# Altium footprint library SMD_Bauteile.PcbLib: 355 footprints (part 4 of 23)
Each footprint in its own frame and in the unit in brackets; x right, y up, seen from the top. Pads: shape width x height; smd on the part's side, far side on the other; paste and mask are expansions set on the pad; w line width, h text height; cw(c..) or ccw(c..) is an arc to the next point about the centre after c.
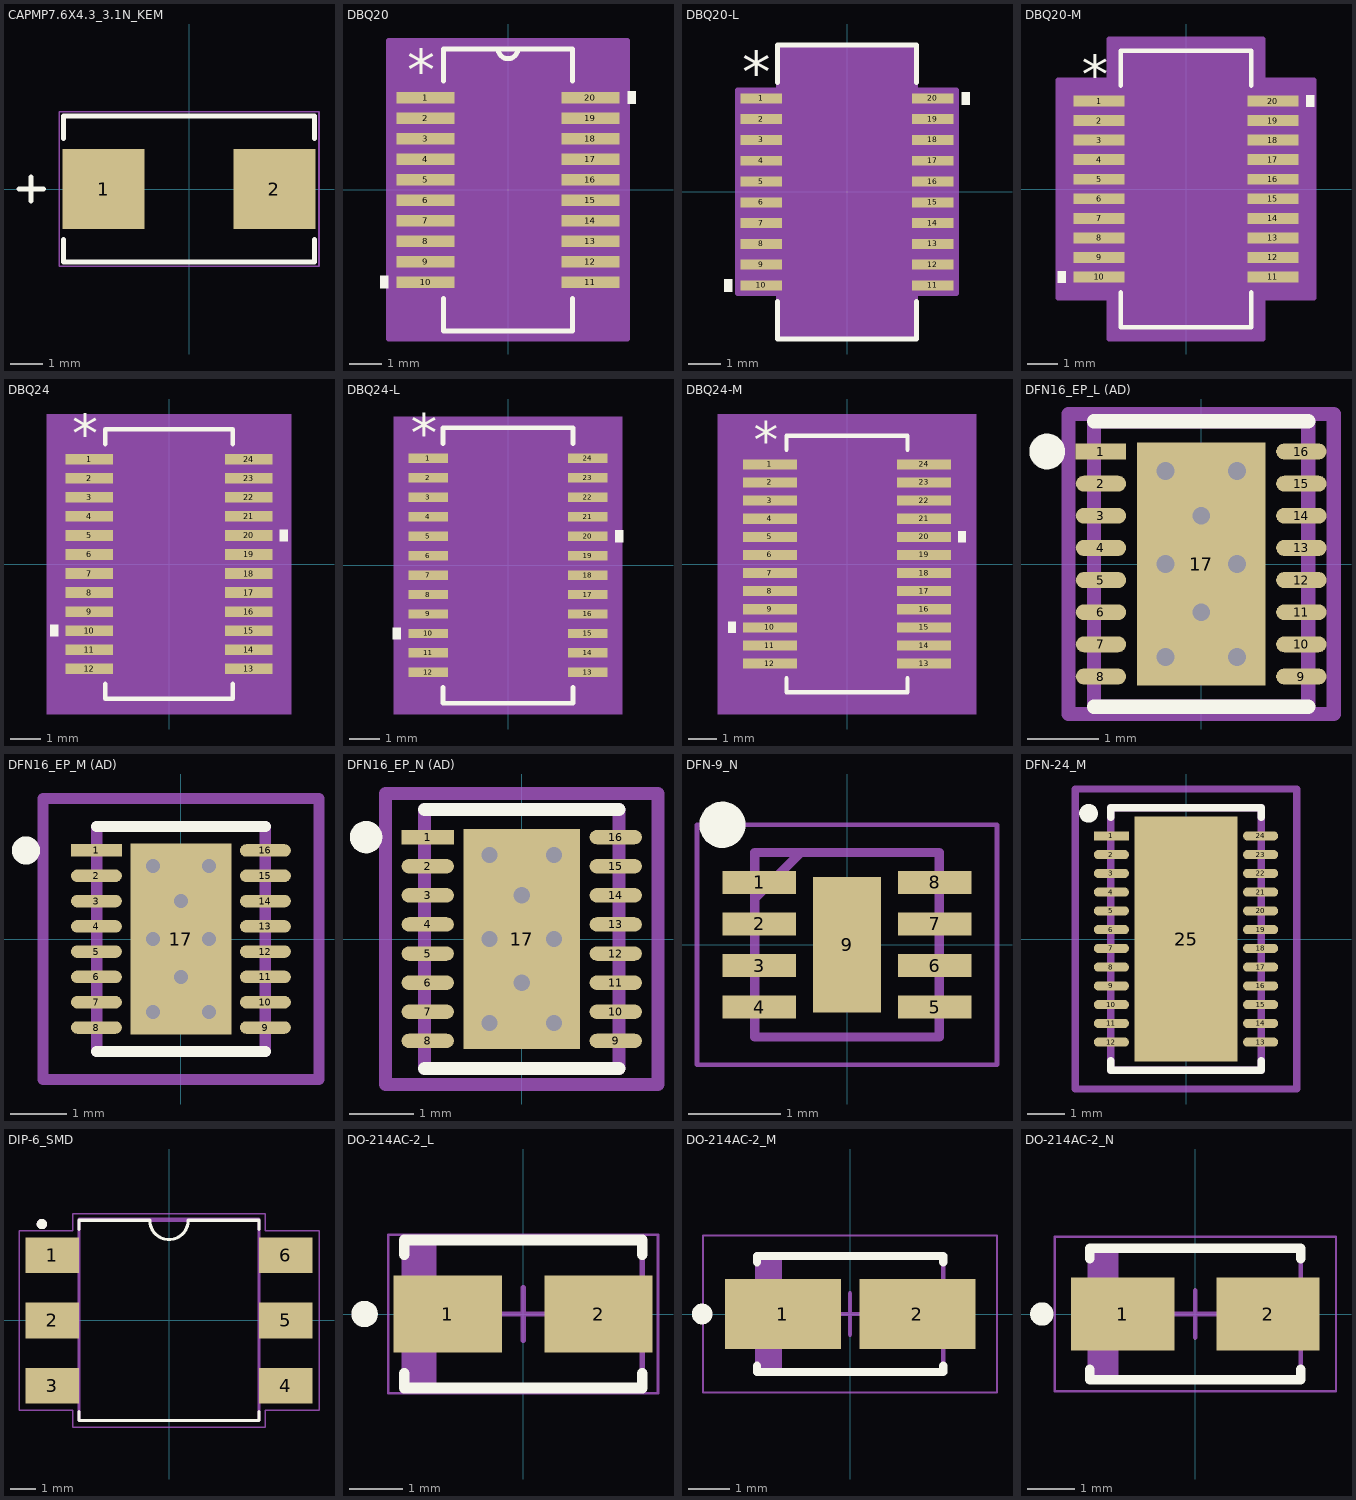
[diagram p3: the footprints below, top view; thin cyan lines are the x and y axes]

## CAPMP7.6X4.3_3.1N_KEM [mm]
pads (2):
  rect 2.56x2.5 smd paste+0 mask+0: 1(-2.672,0) 2(2.672,0)
Top Overlay:
  lines w0.152: -5.316,0 -4.554,0 ; -4.935,-0.381 -4.935,0.381 ; -3.927,-1.583 -3.927,-2.277 3.927,-2.277 3.927,-1.583 ; -3.927,1.583 -3.927,2.277 3.927,2.277 3.927,1.583
Mech Misc 1:
  lines w0.05: -5.316,0 -4.554,0 ; -4.935,-0.381 -4.935,0.381 ; -4.054,-2.413 -4.054,2.413 4.064,2.413 4.064,-2.413 -4.054,-2.413
3D body "CAPMP76X43_31N_KEM.step": height 3.15, standoff 0, extent -3.775,-2.15 3.825,2.15

## DBQ20 [mil]
pads (20):
  rect 71x14 smd paste-35.5 mask-35.5: 1(-100.5,112.5) 2(-100.5,87.5) 3(-100.5,62.5) 4(-100.5,37.5) 5(-100.5,12.5) 6(-100.5,-12.5) 7(-100.5,-37.5) 8(-100.5,-62.5) 9(-100.5,-87.5) 10(-100.5,-112.5) 11(100.5,-112.5) 12(100.5,-87.5) 13(100.5,-62.5) 14(100.5,-37.5) 15(100.5,-12.5) 16(100.5,12.5) 17(100.5,37.5) 18(100.5,62.5) 19(100.5,87.5) 20(100.5,112.5)
Top Overlay:
  region: -146,-105 -156,-105 -156,-120 -146,-120
  region: 146,120 156,120 156,105 146,105
  lines w6: -78.5,-132.6 -78.5,-172 78.5,-172 78.5,-132.6 ; -78.5,132.6 -78.5,172 78.5,172 78.5,132.6 ; -12,172 ccw(c0,172) 12,172
  text "*" at -123,121.5 h50
Mech Misc 1:
  lines w0: -12,172 ccw(c0,172) 12,172
  lines w1: -122,-118.5 -122,-106.5 -78.5,-106.5 -78.5,-118.5 -122,-118.5 ; -122,-93.5 -122,-81.5 -78.5,-81.5 -78.5,-93.5 -122,-93.5 ; -122,-68.5 -122,-56.5 -78.5,-56.5 -78.5,-68.5 -122,-68.5 ; -122,-43.5 -122,-31.5 -78.5,-31.5 -78.5,-43.5 -122,-43.5 ; -122,-18.5 -122,-6.5 -78.5,-6.5 -78.5,-18.5 -122,-18.5 ; -122,6.5 -122,18.5 -78.5,18.5 -78.5,6.5 -122,6.5 ; -122,31.5 -122,43.5 -78.5,43.5 -78.5,31.5 -122,31.5 ; -122,56.5 -122,68.5 -78.5,68.5 -78.5,56.5 -122,56.5 ; -122,81.5 -122,93.5 -78.5,93.5 -78.5,81.5 -122,81.5 ; -122,106.5 -122,118.5 -78.5,118.5 -78.5,106.5 -122,106.5 ; -78.5,-172 78.5,-172 78.5,172 -78.5,172 -78.5,-172 ; 78.5,-118.5 78.5,-106.5 122,-106.5 122,-118.5 78.5,-118.5 ; 78.5,-93.5 78.5,-81.5 122,-81.5 122,-93.5 78.5,-93.5 ; 78.5,-68.5 78.5,-56.5 122,-56.5 122,-68.5 78.5,-68.5 ; 78.5,-43.5 78.5,-31.5 122,-31.5 122,-43.5 78.5,-43.5 ; 78.5,-18.5 78.5,-6.5 122,-6.5 122,-18.5 78.5,-18.5 ; 78.5,6.5 78.5,18.5 122,18.5 122,6.5 78.5,6.5 ; 78.5,31.5 78.5,43.5 122,43.5 122,31.5 78.5,31.5 ; 78.5,56.5 78.5,68.5 122,68.5 122,56.5 78.5,56.5 ; 78.5,81.5 78.5,93.5 122,93.5 122,81.5 78.5,81.5 ; 78.5,106.5 78.5,118.5 122,118.5 122,106.5 78.5,106.5
  text "*" at -123,121.5 h50
Mech 15:
  region: 146,-182 -146,-182 -146,182 146,182
  lines w6: -146,-182 -146,182 146,182 146,-182 -146,-182
3D body "DBQ20.step": height 69.09, standoff 0, extent -122.01,-172.01 122.01,172.01

## DBQ20-L [mil]
pads (20):
  rect 49.5x12 smd paste+0 mask+0: 1(-103.25,112.5) 2(-103.25,87.5) 3(-103.25,62.5) 4(-103.25,37.5) 5(-103.25,12.5) 6(-103.25,-12.5) 7(-103.25,-37.5) 8(-103.25,-62.5) 9(-103.25,-87.5) 10(-103.25,-112.5) 11(103.25,-112.5) 12(103.25,-87.5) 13(103.25,-62.5) 14(103.25,-37.5) 15(103.25,-12.5) 16(103.25,12.5) 17(103.25,37.5) 18(103.25,62.5) 19(103.25,87.5) 20(103.25,112.5)
Top Overlay:
  region: -138,-105 -148,-105 -148,-120 -138,-120
  region: 138,120 148,120 148,105 138,105
  lines w6: -83.5,-131.6 -83.5,-177 83.5,-177 83.5,-131.6 ; -83.5,131.6 -83.5,177 83.5,177 83.5,131.6
  text "*" at -125.75,119.5 h50
Mech Misc 1:
  lines w0: -12,172 ccw(c0,172) 12,172
  lines w1: -122,-118.5 -122,-106.5 -78.5,-106.5 -78.5,-118.5 -122,-118.5 ; -122,-93.5 -122,-81.5 -78.5,-81.5 -78.5,-93.5 -122,-93.5 ; -122,-68.5 -122,-56.5 -78.5,-56.5 -78.5,-68.5 -122,-68.5 ; -122,-43.5 -122,-31.5 -78.5,-31.5 -78.5,-43.5 -122,-43.5 ; -122,-18.5 -122,-6.5 -78.5,-6.5 -78.5,-18.5 -122,-18.5 ; -122,6.5 -122,18.5 -78.5,18.5 -78.5,6.5 -122,6.5 ; -122,31.5 -122,43.5 -78.5,43.5 -78.5,31.5 -122,31.5 ; -122,56.5 -122,68.5 -78.5,68.5 -78.5,56.5 -122,56.5 ; -122,81.5 -122,93.5 -78.5,93.5 -78.5,81.5 -122,81.5 ; -122,106.5 -122,118.5 -78.5,118.5 -78.5,106.5 -122,106.5 ; -78.5,-172 78.5,-172 78.5,172 -78.5,172 -78.5,-172 ; 78.5,-118.5 78.5,-106.5 122,-106.5 122,-118.5 78.5,-118.5 ; 78.5,-93.5 78.5,-81.5 122,-81.5 122,-93.5 78.5,-93.5 ; 78.5,-68.5 78.5,-56.5 122,-56.5 122,-68.5 78.5,-68.5 ; 78.5,-43.5 78.5,-31.5 122,-31.5 122,-43.5 78.5,-43.5 ; 78.5,-18.5 78.5,-6.5 122,-6.5 122,-18.5 78.5,-18.5 ; 78.5,6.5 78.5,18.5 122,18.5 122,6.5 78.5,6.5 ; 78.5,31.5 78.5,43.5 122,43.5 122,31.5 78.5,31.5 ; 78.5,56.5 78.5,68.5 122,68.5 122,56.5 78.5,56.5 ; 78.5,81.5 78.5,93.5 122,93.5 122,81.5 78.5,81.5 ; 78.5,106.5 78.5,118.5 122,118.5 122,106.5 78.5,106.5
  text "*" at -76,119 h50
Mech 15:
  region: -82.5,-122.5 -132,-122.5 -132,122.5 -82.5,122.5 -82.5,176 82.5,176 82.5,122.5 132,122.5 132,-122.5 82.5,-122.5 82.5,-176 -82.5,-176
  lines w6: -132,-122.5 -132,122.5 -82.5,122.5 -82.5,176 82.5,176 82.5,122.5 132,122.5 132,-122.5 82.5,-122.5 82.5,-176 -82.5,-176 -82.5,-122.5 -132,-122.5
3D body "DBQ20.step": height 69.09, standoff 0, extent -122.01,-172.01 122.01,172.01

## DBQ20-M [mil]
pads (20):
  rect 65.5x14 smd paste+0 mask+0: 1(-111.25,112.5) 2(-111.25,87.5) 3(-111.25,62.5) 4(-111.25,37.5) 5(-111.25,12.5) 6(-111.25,-12.5) 7(-111.25,-37.5) 8(-111.25,-62.5) 9(-111.25,-87.5) 10(-111.25,-112.5) 11(111.25,-112.5) 12(111.25,-87.5) 13(111.25,-62.5) 14(111.25,-37.5) 15(111.25,-12.5) 16(111.25,12.5) 17(111.25,37.5) 18(111.25,62.5) 19(111.25,87.5) 20(111.25,112.5)
Top Overlay:
  region: 154,120 164,120 164,105 154,105
  region: -154,-105 -164,-105 -164,-120 -154,-120
  lines w6: -83.5,-132.6 -83.5,-177 83.5,-177 83.5,-132.6 ; -83.5,132.6 -83.5,177 83.5,177 83.5,132.6
  text "*" at -133.75,121.5 h50
Mech Misc 1:
  lines w0: -12,172 ccw(c0,172) 12,172
  lines w1: -122,-118.5 -78.5,-118.5 -78.5,-106.5 -122,-106.5 -122,-118.5 ; -122,-93.5 -78.5,-93.5 -78.5,-81.5 -122,-81.5 -122,-93.5 ; -122,-68.5 -78.5,-68.5 -78.5,-56.5 -122,-56.5 -122,-68.5 ; -122,-43.5 -78.5,-43.5 -78.5,-31.5 -122,-31.5 -122,-43.5 ; -122,-18.5 -78.5,-18.5 -78.5,-6.5 -122,-6.5 -122,-18.5 ; -122,6.5 -78.5,6.5 -78.5,18.5 -122,18.5 -122,6.5 ; -122,31.5 -78.5,31.5 -78.5,43.5 -122,43.5 -122,31.5 ; -122,56.5 -78.5,56.5 -78.5,68.5 -122,68.5 -122,56.5 ; -122,81.5 -78.5,81.5 -78.5,93.5 -122,93.5 -122,81.5 ; -122,106.5 -78.5,106.5 -78.5,118.5 -122,118.5 -122,106.5 ; -78.5,-172 -78.5,172 78.5,172 78.5,-172 -78.5,-172 ; 78.5,-118.5 122,-118.5 122,-106.5 78.5,-106.5 78.5,-118.5 ; 78.5,-93.5 122,-93.5 122,-81.5 78.5,-81.5 78.5,-93.5 ; 78.5,-68.5 122,-68.5 122,-56.5 78.5,-56.5 78.5,-68.5 ; 78.5,-43.5 122,-43.5 122,-31.5 78.5,-31.5 78.5,-43.5 ; 78.5,-18.5 122,-18.5 122,-6.5 78.5,-6.5 78.5,-18.5 ; 78.5,6.5 122,6.5 122,18.5 78.5,18.5 78.5,6.5 ; 78.5,31.5 122,31.5 122,43.5 78.5,43.5 78.5,31.5 ; 78.5,56.5 122,56.5 122,68.5 78.5,68.5 78.5,56.5 ; 78.5,81.5 122,81.5 122,93.5 78.5,93.5 78.5,81.5 ; 78.5,106.5 122,106.5 122,118.5 78.5,118.5 78.5,106.5
  text "*" at -76,119 h50
Mech 15:
  region: -98.5,-139.5 -164,-139.5 -164,139.5 -98.5,139.5 -98.5,192 98.5,192 98.5,139.5 164,139.5 164,-139.5 98.5,-139.5 98.5,-192 -98.5,-192
  lines w6: -164,-139.5 -98.5,-139.5 -98.5,-192 98.5,-192 98.5,-139.5 164,-139.5 164,139.5 98.5,139.5 98.5,192 -98.5,192 -98.5,139.5 -164,139.5 -164,-139.5
3D body "DBQ20.step": height 69.09, standoff 0, extent -122.01,-172.01 122.01,172.01

## DBQ24 [mil]
pads (24):
  rect 62.56x13.97 smd paste+0 mask+0: 1(-104.5,137.5) 2(-104.5,112.5) 3(-104.5,87.5) 4(-104.5,62.5) 5(-104.5,37.5) 6(-104.5,12.5) 7(-104.5,-12.5) 8(-104.5,-37.5) 9(-104.5,-62.5) 10(-104.5,-87.5) 11(-104.5,-112.5) 12(-104.5,-137.5) 13(104.5,-137.5) 14(104.5,-112.5) 15(104.5,-87.5) 16(104.5,-62.5) 17(104.5,-37.5) 18(104.5,-12.5) 19(104.5,12.5) 20(104.5,37.5) 21(104.5,62.5) 22(104.5,87.5) 23(104.5,112.5) 24(104.5,137.5)
Top Overlay:
  region: 145.78,45 155.78,45 155.78,30 145.78,30
  region: -145.78,-80 -155.78,-80 -155.78,-95 -145.78,-95
  lines w6: -83.5,-157.58 -83.5,-177 83.5,-177 83.5,-157.58 ; -83.5,157.58 -83.5,177 83.5,177 83.5,157.58
  text "*" at -127,146.47 h50
Mech 5:
  region: 160.78,-197 -160.78,-197 -160.78,197 160.78,197
Mech Misc 1:
  lines w0: -12,172 ccw(c0,172) 12,172
  lines w1: -122,-143.5 -78.5,-143.5 -78.5,-131.5 -122,-131.5 -122,-143.5 ; -122,-118.5 -78.5,-118.5 -78.5,-106.5 -122,-106.5 -122,-118.5 ; -122,-93.5 -78.5,-93.5 -78.5,-81.5 -122,-81.5 -122,-93.5 ; -122,-68.5 -78.5,-68.5 -78.5,-56.5 -122,-56.5 -122,-68.5 ; -122,-43.5 -78.5,-43.5 -78.5,-31.5 -122,-31.5 -122,-43.5 ; -122,-18.5 -78.5,-18.5 -78.5,-6.5 -122,-6.5 -122,-18.5 ; -122,6.5 -78.5,6.5 -78.5,18.5 -122,18.5 -122,6.5 ; -122,31.5 -78.5,31.5 -78.5,43.5 -122,43.5 -122,31.5 ; -122,56.5 -78.5,56.5 -78.5,68.5 -122,68.5 -122,56.5 ; -122,81.5 -78.5,81.5 -78.5,93.5 -122,93.5 -122,81.5 ; -122,106.5 -78.5,106.5 -78.5,118.5 -122,118.5 -122,106.5 ; -122,131.5 -78.5,131.5 -78.5,143.5 -122,143.5 -122,131.5 ; -78.5,-172 -78.5,172 78.5,172 78.5,-172 -78.5,-172 ; 78.5,-143.5 122,-143.5 122,-131.5 78.5,-131.5 78.5,-143.5 ; 78.5,-118.5 122,-118.5 122,-106.5 78.5,-106.5 78.5,-118.5 ; 78.5,-93.5 122,-93.5 122,-81.5 78.5,-81.5 78.5,-93.5 ; 78.5,-68.5 122,-68.5 122,-56.5 78.5,-56.5 78.5,-68.5 ; 78.5,-43.5 122,-43.5 122,-31.5 78.5,-31.5 78.5,-43.5 ; 78.5,-18.5 122,-18.5 122,-6.5 78.5,-6.5 78.5,-18.5 ; 78.5,6.5 122,6.5 122,18.5 78.5,18.5 78.5,6.5 ; 78.5,31.5 122,31.5 122,43.5 78.5,43.5 78.5,31.5 ; 78.5,56.5 122,56.5 122,68.5 78.5,68.5 78.5,56.5 ; 78.5,81.5 122,81.5 122,93.5 78.5,93.5 78.5,81.5 ; 78.5,106.5 122,106.5 122,118.5 78.5,118.5 78.5,106.5 ; 78.5,131.5 122,131.5 122,143.5 78.5,143.5 78.5,131.5
  text "*" at -76,119 h50
Mech 15:
  region: -88.5,-154.48 -145.78,-154.48 -145.78,154.48 -88.5,154.48 -88.5,182 88.5,182 88.5,154.48 145.78,154.48 145.78,-154.48 88.5,-154.48 88.5,-182 -88.5,-182
  lines w6: -145.78,-154.48 -88.5,-154.48 -88.5,-182 88.5,-182 88.5,-154.48 145.78,-154.48 145.78,154.48 88.5,154.48 88.5,182 -88.5,182 -88.5,154.48 -145.78,154.48 -145.78,-154.48
3D body "DBQ24.step": height 67.09, standoff 0, extent -122.01,-172.01 122.01,172.01

## DBQ24-L [mil]
pads (24):
  rect 50.75x12 smd paste+0 mask+0: 1(-102.53,137.5) 2(-102.53,112.5) 3(-102.53,87.5) 4(-102.53,62.5) 5(-102.53,37.5) 6(-102.53,12.5) 7(-102.53,-12.5) 8(-102.53,-37.5) 9(-102.53,-62.5) 10(-102.53,-87.5) 11(-102.53,-112.5) 12(-102.53,-137.5) 13(102.53,-137.5) 14(102.53,-112.5) 15(102.53,-87.5) 16(102.53,-62.5) 17(102.53,-37.5) 18(102.53,-12.5) 19(102.53,12.5) 20(102.53,37.5) 21(102.53,62.5) 22(102.53,87.5) 23(102.53,112.5) 24(102.53,137.5)
Top Overlay:
  region: -137.91,-80 -147.91,-80 -147.91,-95 -137.91,-95
  region: 137.91,45 147.91,45 147.91,30 137.91,30
  lines w6: -83.5,-156.6 -83.5,-177 83.5,-177 83.5,-156.6 ; -83.5,156.6 -83.5,177 83.5,177 83.5,156.6
  text "*" at -125.03,144.5 h50
Mech 5:
  region: 146.91,-191 -146.91,-191 -146.91,191 146.91,191
Mech Misc 1:
  lines w0: -12,172 ccw(c0,172) 12,172
  lines w1: -122,-143.5 -122,-131.5 -78.5,-131.5 -78.5,-143.5 -122,-143.5 ; -122,-118.5 -122,-106.5 -78.5,-106.5 -78.5,-118.5 -122,-118.5 ; -122,-93.5 -122,-81.5 -78.5,-81.5 -78.5,-93.5 -122,-93.5 ; -122,-68.5 -122,-56.5 -78.5,-56.5 -78.5,-68.5 -122,-68.5 ; -122,-43.5 -122,-31.5 -78.5,-31.5 -78.5,-43.5 -122,-43.5 ; -122,-18.5 -122,-6.5 -78.5,-6.5 -78.5,-18.5 -122,-18.5 ; -122,6.5 -122,18.5 -78.5,18.5 -78.5,6.5 -122,6.5 ; -122,31.5 -122,43.5 -78.5,43.5 -78.5,31.5 -122,31.5 ; -122,56.5 -122,68.5 -78.5,68.5 -78.5,56.5 -122,56.5 ; -122,81.5 -122,93.5 -78.5,93.5 -78.5,81.5 -122,81.5 ; -122,106.5 -122,118.5 -78.5,118.5 -78.5,106.5 -122,106.5 ; -122,131.5 -122,143.5 -78.5,143.5 -78.5,131.5 -122,131.5 ; -78.5,-172 78.5,-172 78.5,172 -78.5,172 -78.5,-172 ; 78.5,-143.5 78.5,-131.5 122,-131.5 122,-143.5 78.5,-143.5 ; 78.5,-118.5 78.5,-106.5 122,-106.5 122,-118.5 78.5,-118.5 ; 78.5,-93.5 78.5,-81.5 122,-81.5 122,-93.5 78.5,-93.5 ; 78.5,-68.5 78.5,-56.5 122,-56.5 122,-68.5 78.5,-68.5 ; 78.5,-43.5 78.5,-31.5 122,-31.5 122,-43.5 78.5,-43.5 ; 78.5,-18.5 78.5,-6.5 122,-6.5 122,-18.5 78.5,-18.5 ; 78.5,6.5 78.5,18.5 122,18.5 122,6.5 78.5,6.5 ; 78.5,31.5 78.5,43.5 122,43.5 122,31.5 78.5,31.5 ; 78.5,56.5 78.5,68.5 122,68.5 122,56.5 78.5,56.5 ; 78.5,81.5 78.5,93.5 122,93.5 122,81.5 78.5,81.5 ; 78.5,106.5 78.5,118.5 122,118.5 122,106.5 78.5,106.5 ; 78.5,131.5 78.5,143.5 122,143.5 122,131.5 78.5,131.5
  text "*" at -76,119 h50
Mech 15:
  region: -82.5,-147.5 -131.91,-147.5 -131.91,147.5 -82.5,147.5 -82.5,176 82.5,176 82.5,147.5 131.91,147.5 131.91,-147.5 82.5,-147.5 82.5,-176 -82.5,-176
  lines w6: -131.91,-147.5 -131.91,147.5 -82.5,147.5 -82.5,176 82.5,176 82.5,147.5 131.91,147.5 131.91,-147.5 82.5,-147.5 82.5,-176 -82.5,-176 -82.5,-147.5 -131.91,-147.5
3D body "DBQ24.step": height 67.09, standoff 0, extent -122.01,-172.01 122.01,172.01

## DBQ24-M [mil]
pads (24):
  rect 74.37x13.97 smd paste+0 mask+0: 1(-106.47,137.5) 2(-106.47,112.5) 3(-106.47,87.5) 4(-106.47,62.5) 5(-106.47,37.5) 6(-106.47,12.5) 7(-106.47,-12.5) 8(-106.47,-37.5) 9(-106.47,-62.5) 10(-106.47,-87.5) 11(-106.47,-112.5) 12(-106.47,-137.5) 13(106.47,-137.5) 14(106.47,-112.5) 15(106.47,-87.5) 16(106.47,-62.5) 17(106.47,-37.5) 18(106.47,-12.5) 19(106.47,12.5) 20(106.47,37.5) 21(106.47,62.5) 22(106.47,87.5) 23(106.47,112.5) 24(106.47,137.5)
Top Overlay:
  region: -153.65,-80 -163.65,-80 -163.65,-95 -153.65,-95
  region: 153.65,45 163.65,45 163.65,30 153.65,30
  lines w6: -83.5,-157.58 -83.5,-177 83.5,-177 83.5,-157.58 ; -83.5,157.58 -83.5,177 83.5,177 83.5,157.58
  text "*" at -128.97,146.47 h50
Mech 5:
  region: 178.65,-207 -178.65,-207 -178.65,207 178.65,207
Mech Misc 1:
  lines w0: -12,172 ccw(c0,172) 12,172
  lines w1: -122,-143.5 -122,-131.5 -78.5,-131.5 -78.5,-143.5 -122,-143.5 ; -122,-118.5 -122,-106.5 -78.5,-106.5 -78.5,-118.5 -122,-118.5 ; -122,-93.5 -122,-81.5 -78.5,-81.5 -78.5,-93.5 -122,-93.5 ; -122,-68.5 -122,-56.5 -78.5,-56.5 -78.5,-68.5 -122,-68.5 ; -122,-43.5 -122,-31.5 -78.5,-31.5 -78.5,-43.5 -122,-43.5 ; -122,-18.5 -122,-6.5 -78.5,-6.5 -78.5,-18.5 -122,-18.5 ; -122,6.5 -122,18.5 -78.5,18.5 -78.5,6.5 -122,6.5 ; -122,31.5 -122,43.5 -78.5,43.5 -78.5,31.5 -122,31.5 ; -122,56.5 -122,68.5 -78.5,68.5 -78.5,56.5 -122,56.5 ; -122,81.5 -122,93.5 -78.5,93.5 -78.5,81.5 -122,81.5 ; -122,106.5 -122,118.5 -78.5,118.5 -78.5,106.5 -122,106.5 ; -122,131.5 -122,143.5 -78.5,143.5 -78.5,131.5 -122,131.5 ; -78.5,-172 78.5,-172 78.5,172 -78.5,172 -78.5,-172 ; 78.5,-143.5 78.5,-131.5 122,-131.5 122,-143.5 78.5,-143.5 ; 78.5,-118.5 78.5,-106.5 122,-106.5 122,-118.5 78.5,-118.5 ; 78.5,-93.5 78.5,-81.5 122,-81.5 122,-93.5 78.5,-93.5 ; 78.5,-68.5 78.5,-56.5 122,-56.5 122,-68.5 78.5,-68.5 ; 78.5,-43.5 78.5,-31.5 122,-31.5 122,-43.5 78.5,-43.5 ; 78.5,-18.5 78.5,-6.5 122,-6.5 122,-18.5 78.5,-18.5 ; 78.5,6.5 78.5,18.5 122,18.5 122,6.5 78.5,6.5 ; 78.5,31.5 78.5,43.5 122,43.5 122,31.5 78.5,31.5 ; 78.5,56.5 78.5,68.5 122,68.5 122,56.5 78.5,56.5 ; 78.5,81.5 78.5,93.5 122,93.5 122,81.5 78.5,81.5 ; 78.5,106.5 78.5,118.5 122,118.5 122,106.5 78.5,106.5 ; 78.5,131.5 78.5,143.5 122,143.5 122,131.5 78.5,131.5
  text "*" at -76,119 h50
Mech 15:
  region: -98.5,-164.48 -163.65,-164.48 -163.65,164.48 -98.5,164.48 -98.5,192 98.5,192 98.5,164.48 163.65,164.48 163.65,-164.48 98.5,-164.48 98.5,-192 -98.5,-192
  lines w6: -163.65,-164.48 -163.65,164.48 -98.5,164.48 -98.5,192 98.5,192 98.5,164.48 163.65,164.48 163.65,-164.48 98.5,-164.48 98.5,-192 -98.5,-192 -98.5,-164.48 -163.65,-164.48
3D body "DBQ24.step": height 67.09, standoff 0, extent -122.01,-172.01 122.01,172.01

## DFN16_EP_L (AD) [mm]
pads (17):
  rect 0.706x0.222 smd paste+0 mask+0: 1(-1.403,1.575)
  rrect100% 0.706x0.222 smd paste+0 mask+0: 2(-1.403,1.125) 3(-1.403,0.675) 4(-1.403,0.225) 5(-1.403,-0.225) 6(-1.403,-0.675) 7(-1.403,-1.125) 8(-1.403,-1.575) 9(1.403,-1.575) 10(1.403,-1.125) 11(1.403,-0.675) 12(1.403,-0.225) 13(1.403,0.225) 14(1.403,0.675) 15(1.403,1.125) 16(1.403,1.575)
  rect 1.8x3.4 smd paste-1000 mask+0: 17(0,0)
via -0.5,1.3 diameter 0.6 hole 0.25
via 0.5,1.3 diameter 0.6 hole 0.25
via -0.5,-1.3 diameter 0.6 hole 0.25
via 0.5,-1.3 diameter 0.6 hole 0.25
via 0,0.675 diameter 0.6 hole 0.25
via 0,-0.675 diameter 0.6 hole 0.25
via -0.5,0 diameter 0.6 hole 0.25
via 0.5,0 diameter 0.6 hole 0.25
Top Overlay:
  circle w0.25: c-2.156,1.575 r0.125
  lines w0.2: -1.5,-2 1.5,-2 ; -1.5,2 1.5,2
Top Paste:
  rectangle: -0.479,-1.279 0.479,1.279
Bottom Designator:
  lines w0.2: -1.856,-2.1 1.856,-2.1 1.856,2.1 -1.856,2.1 -1.856,-2.1
Bottom 3D Body:
  lines w0.1: -0.5,0 0.5,0 ; 0,-0.5 0,0.5
Mechanical 18:
  lines w0.2: -1.5,-2 1.5,-2 1.5,2 -1.5,2 -1.5,-2
Top Component Center:
  lines w0.2: -1.856,-2.1 1.856,-2.1 1.856,2.1 -1.856,2.1 -1.856,-2.1
3D body "IC_Analog_Devices_LTC2379IDE-18#PBF_eec.STEP": height 0.25, standoff 0, extent -1.856,-2.1 1.856,2.1

## DFN16_EP_M (AD) [mm]
pads (17):
  rect 0.906x0.222 smd paste+0 mask+0: 1(-1.503,1.575)
  rrect100% 0.906x0.222 smd paste+0 mask+0: 2(-1.503,1.125) 3(-1.503,0.675) 4(-1.503,0.225) 5(-1.503,-0.225) 6(-1.503,-0.675) 7(-1.503,-1.125) 8(-1.503,-1.575) 9(1.503,-1.575) 10(1.503,-1.125) 11(1.503,-0.675) 12(1.503,-0.225) 13(1.503,0.225) 14(1.503,0.675) 15(1.503,1.125) 16(1.503,1.575)
  rect 1.8x3.4 smd paste-1000 mask+0: 17(0,0)
via 0.5,1.3 diameter 0.6 hole 0.25
via -0.5,-1.3 diameter 0.6 hole 0.25
via 0.5,-1.3 diameter 0.6 hole 0.25
via 0,0.675 diameter 0.6 hole 0.25
via 0,-0.675 diameter 0.6 hole 0.25
via -0.5,0 diameter 0.6 hole 0.25
via 0.5,0 diameter 0.6 hole 0.25
via -0.5,1.3 diameter 0.6 hole 0.25
Top Overlay:
  circle w0.25: c-2.756,1.575 r0.125
  lines w0.2: -1.5,-2 1.5,-2 ; -1.5,2 1.5,2
Top Paste:
  rectangle: -0.479,-1.279 0.479,1.279
Bottom Designator:
  lines w0.2: -2.456,-2.5 -2.456,2.5 2.456,2.5 2.456,-2.5 -2.456,-2.5
Bottom 3D Body:
  lines w0.1: -0.5,0 0.5,0 ; 0,-0.5 0,0.5
Mechanical 18:
  lines w0.2: -1.5,-2 -1.5,2 1.5,2 1.5,-2 -1.5,-2
Top Component Center:
  lines w0.2: -2.456,-2.5 -2.456,2.5 2.456,2.5 2.456,-2.5 -2.456,-2.5
3D body "IC_Analog_Devices_LTC2379IDE-18#PBF_eec.STEP": height 0.25, standoff 0, extent -2.456,-2.5 2.456,2.5

## DFN16_EP_N (AD) [mm]
pads (17):
  rect 0.806x0.222 smd paste+0 mask+0: 1(-1.453,1.575)
  rrect100% 0.806x0.222 smd paste+0 mask+0: 2(-1.453,1.125) 3(-1.453,0.675) 4(-1.453,0.225) 5(-1.453,-0.225) 6(-1.453,-0.675) 7(-1.453,-1.125) 8(-1.453,-1.575) 9(1.453,-1.575) 10(1.453,-1.125) 11(1.453,-0.675) 12(1.453,-0.225) 13(1.453,0.225) 14(1.453,0.675) 15(1.453,1.125) 16(1.453,1.575)
  rect 1.8x3.4 smd paste-1000 mask+0: 17(0,0)
via 0.5,0 diameter 0.6 hole 0.25
via -0.5,0 diameter 0.6 hole 0.25
via 0,-0.675 diameter 0.6 hole 0.25
via 0,0.675 diameter 0.6 hole 0.25
via 0.5,-1.3 diameter 0.6 hole 0.25
via -0.5,-1.3 diameter 0.6 hole 0.25
via 0.5,1.3 diameter 0.6 hole 0.25
via -0.5,1.3 diameter 0.6 hole 0.25
Top Overlay:
  circle w0.25: c-2.406,1.575 r0.125
  lines w0.2: -1.5,-2 1.5,-2 ; -1.5,2 1.5,2
Top Paste:
  rectangle: -0.479,-1.279 0.479,1.279
Bottom Designator:
  lines w0.2: -2.106,-2.25 -2.106,2.25 2.106,2.25 2.106,-2.25 -2.106,-2.25
Bottom 3D Body:
  lines w0.1: -0.5,0 0.5,0 ; 0,-0.5 0,0.5
Mechanical 18:
  lines w0.2: -1.5,-2 -1.5,2 1.5,2 1.5,-2 -1.5,-2
Top Component Center:
  lines w0.2: -2.106,-2.25 -2.106,2.25 2.106,2.25 2.106,-2.25 -2.106,-2.25
3D body "IC_Analog_Devices_LTC2379IDE-18#PBF_eec.STEP": height 0.25, standoff 0, extent -2.106,-2.25 2.106,2.25

## DFN-9_N [mm] "Analog Devices DFN-8"
pads (9):
  rect 0.8x0.25 smd: 1(-0.95,0.675) 2(-0.95,0.225) 3(-0.95,-0.225) 4(-0.95,-0.675) 5(0.95,-0.675) 6(0.95,-0.225) 7(0.95,0.225) 8(0.95,0.675)
  rect 0.74x1.47 smd: 9(0,0)
Top Overlay:
  circle w0.25: c-1.35,1.3 r0.125
Mech Misc 1:
  lines w0.1: -1,0.5 -0.5,1 ; -1,-1 -1,1 1,1 1,-1 -1,-1
Mech 15:
  lines w0.05: -1.625,-1.3 -1.625,1.3 1.625,1.3 1.625,-1.3 -1.625,-1.3
3D body "LT3060EDC-3.3#TRMPBF.stp": height 0.8, standoff 0, extent -1.05,-1 1.05,1

## DFN-24_M [mm] "DKD Package 24 Lead Plastic DFN (7mmx4mm)"
pads (25):
  rect 0.936x0.242 smd paste+0 mask+0: 1(-1.988,2.75)
  rrect100% 0.936x0.242 smd paste+0 mask+0: 2(-1.988,2.25) 3(-1.988,1.75) 4(-1.988,1.25) 5(-1.988,0.75) 6(-1.988,0.25) 7(-1.988,-0.25) 8(-1.988,-0.75) 9(-1.988,-1.25) 10(-1.988,-1.75) 11(-1.988,-2.25) 12(-1.988,-2.75) 13(1.988,-2.75) 14(1.988,-2.25) 15(1.988,-1.75) 16(1.988,-1.25) 17(1.988,-0.75) 18(1.988,-0.25) 19(1.988,0.25) 20(1.988,0.75) 21(1.988,1.25) 22(1.988,1.75) 23(1.988,2.25) 24(1.988,2.75)
  rect 2.74x6.53 smd paste-1000 mask+0: 25(0,0)
Top Overlay:
  circle w0.25: c-2.6,3.35 r0.125
  lines w0.2: -2,-3.25 -2,-3.5 2,-3.5 2,-3.25 ; -2,3.25 -2,3.5 2,3.5 2,3.25
Top Paste:
  rectangle: -0.886,0.242 0.886,2.781
  rectangle: -0.886,-2.781 0.886,-0.242
Bottom Designator:
  lines w0.2: -2.956,-4 2.956,-4 2.956,4 -2.956,4 -2.956,-4
Bottom 3D Body:
  lines w0.1: -0.5,0 0.5,0 ; 0,-0.5 0,0.5
Mechanical 18:
  lines w0.2: -2,-3.5 2,-3.5 2,3.5 -2,3.5 -2,-3.5
Top Component Center:
  lines w0.2: -2.956,-4 2.956,-4 2.956,4 -2.956,4 -2.956,-4
3D body "IC_Analog_Devices_LTC2512IDKD-24#PBF_eec.STEP": height 0.25, standoff 0, extent -2.956,-4 2.956,4

## DIP-6_SMD [mm]
height 3.35
pads (6):
  rect 2.09x1.39 smd: 1(-4.54,2.54) 2(-4.54,0) 3(-4.54,-2.54) 4(4.54,-2.54) 5(4.54,0) 6(4.54,2.54)
Top Overlay:
  circle w0.2: c-4.95,3.75 r0.1
  lines w0.127: -3.5,-3.55 -3.5,-3.9 3.5,-3.9 3.5,-3.55 ; -3.5,3.55 -3.5,3.9 -0.75,3.9 ccw(c0,3.9) 0.75,3.9 3.5,3.9 3.5,3.55
Mechanical 4:
  circle w0.2: c-4.95,3.75 r0.1
  circle w0.2: c-4.95,3.75 r0.1
  lines w0.127: -3.5,-3.9 3.5,-3.9 ; -3.5,-3.9 -3.5,3.9 3.5,3.9 3.5,-3.9 ; -3.5,-3.9 3.5,-3.9 ; -3.5,-3.9 -3.5,3.937 3.5,3.937 3.5,-3.9
Mechanical 16:
  lines w0.05: -5.84,-3.49 -3.75,-3.49 -3.75,-4.15 3.75,-4.15 3.75,-3.49 5.84,-3.49 5.84,3.49 3.75,3.49 3.75,4.15 -3.75,4.15 -3.75,3.49 -5.84,3.49 -5.84,-3.49
3D body "DIP-6_SMD.STEP": height 4.68, standoff -0.02, extent -4.762,-4.191 4.762,4.191

## DO-214AC-2_L [mm] "DO-214AC, 2-Leads, Body 4.5x2.79mm, IPC High Density"
height 2.29
pads (2):
  rect 2.05x1.45 smd: 1(-1.425,0) 2(1.425,0)
Top Overlay:
  circle w0.25: c-3,0 r0.125
  lines w0.2: -2.25,-1.125 -2.25,-1.4 2.25,-1.4 2.25,-1.125 ; -2.25,1.125 -2.25,1.4 2.25,1.4 2.25,1.125
Mech Misc 1:
  rectangle: -2.25,-1.395 -1.645,1.395
  lines w0.1: -2.25,-1.395 -2.25,1.395 2.25,1.395 2.25,-1.395 -2.25,-1.395
Mech 15:
  lines w0.05: -2.55,-1.5 -2.55,1.5 2.55,1.5 2.55,-1.5 -2.55,-1.5
  lines w0.1: -0.5,0 0.5,0 ; 0,-0.5 0,0.5
3D body: height 2.29, standoff 0, extent -2.25,-1.395 2.25,1.395

## DO-214AC-2_M [mm] "DO-214AC, 2-Leads, Body 4.5x2.79mm, IPC Low Density"
height 2.29
pads (2):
  rect 2.8x1.7 smd: 1(-1.625,0) 2(1.625,0)
Top Overlay:
  circle w0.25: c-3.575,0 r0.125
  lines w0.2: -2.25,-1.25 -2.25,-1.4 2.25,-1.4 2.25,-1.25 ; -2.25,1.25 -2.25,1.4 2.25,1.4 2.25,1.25
Mech Misc 1:
  rectangle: -2.25,-1.395 -1.645,1.395
  lines w0.1: -2.25,-1.395 2.25,-1.395 2.25,1.395 -2.25,1.395 -2.25,-1.395
Mech 15:
  lines w0.05: -3.55,-1.9 3.55,-1.9 3.55,1.9 -3.55,1.9 -3.55,-1.9
  lines w0.1: -0.5,0 0.5,0 ; 0,-0.5 0,0.5
3D body: height 2.29, standoff 0, extent -2.25,-1.395 2.25,1.395

## DO-214AC-2_N [mm] "DO-214AC, 2-Leads, Body 4.5x2.79mm, IPC Medium Density"
height 2.29
pads (2):
  rect 2.2x1.55 smd: 1(-1.55,0) 2(1.55,0)
Top Overlay:
  circle w0.25: c-3.275,0 r0.125
  lines w0.2: -2.25,-1.175 -2.25,-1.4 2.25,-1.4 2.25,-1.175 ; -2.25,1.175 -2.25,1.4 2.25,1.4 2.25,1.175
Mech Misc 1:
  rectangle: -2.25,-1.395 -1.645,1.395
  lines w0.1: -2.25,-1.395 2.25,-1.395 2.25,1.395 -2.25,1.395 -2.25,-1.395
Mech 15:
  lines w0.05: -3,-1.65 -3,1.65 3,1.65 3,-1.65 -3,-1.65
  lines w0.1: -0.5,0 0.5,0 ; 0,-0.5 0,0.5
3D body: height 2.29, standoff 0, extent -2.25,-1.395 2.25,1.395